# Altium integrated library SubjuGator8.IntLib: 306 symbols (part 1 of 2) (continued)
## SEAM-50-02.0-S-08-2-A-K-TR (continued)
part H pins: C14 I2S1_SDIN "I2S Audio Port 1 Data In", C15 I2S1_CLK "I2S Audio Port 1 Clock", D13 I2S1_LRCLK "I2S Audio Port 1 Field Select", D14 I2S1_SDOUT "I2S Audio Port 1 Data Out", E5 I2S3_SDIN "I2S Audio Port 3 Data In", E6 I2S3_CLK "I2S Audio Port 3 Clock", F1 AUDIO_MCLK "Audio Codec Master Clock", F2 GPIO19/AUD_RST "Aidio Codec Reset", F5 I2S3_LRCLK "I2S Audio Port 3 Field Select", F6 I2S3_SDOUT "I2S Audio Port 3 Data Out", G1 I2S0_SDIN "Digital Audio Port 1 Data In", G2 I2S0_CLK "Digital Audio Port 1 Clock", G5 I2S2_CLK "Digital Audio Port 3 Clock", G6 I2S2_SDIN "Digital Audio Port 3 Data In", H1 I2S0_LRCLK "I2S Audio Port 0 Field Select", H2 IS20_SDOUT "I2S Audio Port 0 Data Out", H3 GPIO20/AUD_INT "Audio Codec Interrupt", H5 I2S2_LRCLK "I2S Audio Port 2 Field Select", H6 I2S2_SDOUT "I2S Audio Port 2 Data Out"
part I pins: A6 I2C_PW_CLK "PM I2C Bus Clock", A15 UART2_CTS# "UART 2 Clear to Send", A16 UART2_RTS# "UART 2 Request to Send", A20 I2C_GP1_DAT "General I2C Bus #1 Data", A21 I2C_GP1_CLK "General I2C Bus #1 Clock", B6 I2C_PM_DAT "PM I2C Bus Data", B15 UART2_RX "UART 2 Receive", B16 UART2_TX "UART 2 Transmit", C6 I2C_CAM_CLK "Camera I2C Clock", D6 I2C_CAM_DAT "Camera I2C Data", D9 UART1_TX "UART 1 Transmit", D10 UART1_RX "UART 1 Receive", D15 I2C_GP0_DAT "General I2C Bus #1 Data", E3 SPI0_CLK "SPI 0 Clock", E4 SPI0_MISO "SPI 0 MISO", E9 UART1_RTS# "Uart 1 Transmit", E10 UART1_CTS# "Uart 1 Receive", E13 SPI1_CS1# "SPI 1 CHip Select 1", E14 SPI1_CS0# "SPI 1 Chip Select 0", E15 I2C_GP0_CLK "General I2C Bus #0 Clock", F3 SPI0_CS0# "SPI 0 Chip Select 0", F4 SPI0_MOSI "SPI 0 MOSI", F13 SPI1_MOSI "SPI 1 MOSI", F14 SPI1_MISO "SPI 1 MISO", F16 SPI2_CS1# "SPI 2 Chip Select 1", G11 UART0_RTS# "UART 1 Return to Send", G12 UART0_RX "UART 1 Receive", G13 SPI1_CLK "SPI 1 Clock", G15 SPI2_MOSI "SPI 2 MOSI", G16 SPI2_CS0# "SPI 2 Chip Select 0", H11 UART0_CTS# "UART 0 Clear to Send", H12 UART0_TX "UART 0 Transmit", H14 SPI2_CLK "SPI 2 Clock", H15 SPI2_MISO "SPI 2 MISO"
part A text: Misc and System
part B text: Power
part C text: Displays
part D text: Cameras
part E text: USB/PCIe/SATA
part F text: Ethernet
part G text: SD and SDIO
part H text: Audio
part I text: Serial

## SFV10R-2STE1HLF
designator U?
CONN FFC TOP 10POS 0.50MM R/A; Manufacturer 1: Amphenol FCI; Manufacturer Part Number 1: SFV10R-2STE1HLF; Supplier Part Number 1: 609-4306-1-ND; Supplier 1: Digi-Key; ComponentLink1URL: https://cdn.amphenol-icc.com/media/wysiwyg/files/drawing/10112793.pdf; ComponentLink1Description: "Datasheet"; ComponentLink2URL: https://www.digikey.com/product-detail/en/amphenol-fci/SFV10R-2STE1HLF/609-4306-1-ND/2626757
footprint SFV10R-2STE1HLF (CONN FFC TOP 10POS 0.50MM R/A)
pins: 0 GND, 1, 2, 3, 4, 5, 6, 7, 8, 9, 10

## SINGLE_SMD_PAD
designator P?
footprint SINGLE_SMD_PAD
pins: 0

## SPST-2DIP-SW
designator P?, comment 219-2LPST
SWITCH TAPE SEAL 2 POS SMD 50V; Supplier 1: Digi-Key; Supplier Part Number 1: CT2192LPST-ND
footprint SPST-4N (For SPST-4DIP)
pins: 1, 2, 3, 4

## SWD_STM32
designator P?, comment SWD
SWD connector matching the pinout on STM Discovery Boards
footprint SWD_STM32 (SWD connector matching the pinout on STM Discovery Boards)
footprint SWD_STM32_SMD (SWD connector matching the pinout on STM Discovery Boards)
pins: 1 3V3, 2 SWCLK, 3 GND, 4 SWDIO, 5 NRST, 6 SWO

## TE-AMP-CONN-2POS
designator P?
2 Positions Header Connector 0.156" (3.96mm) Through Hole Tin; Supplier 1: Digi-Key; Supplier Part Number 1: A99845-ND; Mating Conn. Digi-Key P/N: A103948-ND
footprint TE AMP CONN 2POS (CONN HEADER 2POS STR .156 TIN)
pins: 1, 2

## TE-AMP-CONN-3POS
designator P?
3 Positions Header Connector 0.156" (3.96mm) Through Hole Tin; Supplier 1: Digi-Key; Supplier Part Number 1: A99846-ND; Mating Conn. Digi-Key P/N: A103941-ND
footprint TE AMP CONN 2POS - duplicate (CONN HEADER 3POS STR .156 TIN)
pins: 1, 2, 3

## Test Point
designator TP?
footprint PIN1 (Connector; Plug)
pins: 1

## TX1 standoff
designator MEC?, comment R30-3000702
HEX STANDOFF M3 BRASS 7MM; Manufacturer 1: Harwin, Inc; Manufacturer Part Number 1: R30-3000702; Supplier 1: Digi-Key; Supplier Part Number 1: 952-1498-ND
footprint R30-3000702 (HEX STANDOFF M3 BRASS 7MM)
pins: 1 GND

## tx1_carrier_modified
designator P?, comment Jetson TX1 Connector
CONN MALE 400POS 8ROW SMD GOLD; Manufacturer 1: Samtec Inc; Manufacturer Part Number 1: SEAM-50-02.0-S-08-2-A-K-TR; Supplier 1: Digi-Key; Supplier Part Number 1: SEAM-50-02.0-S-08-2-A-K-TR-ND
footprint tx1_carrier_modified (TX 1 carrier board connector modified to remove pads)
part A pins: A47 RESET_IN# "System Reset output from uill & input to initiate full PMIC reset", A48 CARRIER_PWR_ON "Carrier Power On", B7 CARRIER_STBY# "SOC Power Request", B8 VIN_PWR_BAD# "Input Power Bad", B17 FAN_TACH "Fan Tach", B50 POWER_BTN# "Power on", C16 FAN_PWM "Fan PWM"
part B pins: A1 VDD_IN "Main VDD Input", A2 VDD_IN "Main VDD Input", A3 GND, A4 GND, A28 GND, A37 GND, A40 GND, A43 GND, A50 VDD_RTC "Tegra Real Time Clock block power", B1 VDD_IN "Main VDD Input", B2 VDD_IN "Main VDD Input", B3 GND, B4 GND, B14 GND, B31 GND, B38 GND, B41 GND, B44 GND, B47 GND, C1 VDD_IN "Main VDD Input", C2 VDD_IN "Main VDD Input", C3 GND, C4 GND, C21 GND, C24 GND, C27 GND, C30 GND, C33 GND, C36 GND, C39 GND, C42 GND, C45 GND, D20 GND, D23 GND, D26 GND, D29 GND, D32 GND, D35 GND, D38 GND, D41 GND, D44 GND, E19 GND, E22 GND, E25 GND, E28 GND, E31 GND, E34 GND, E37 GND, E40 GND, E43 GND, E46 GND, F10 GND, F15 GND, F21 GND, F24 GND, F27 GND, F30 GND, F33 GND, F36 GND, F39 GND, F42 GND, F45 GND, F49 GND, G3 GND, G17 GND, G20 GND, G23 GND, G26 GND, G29 GND, G32 GND, G35 GND, G38 GND, G41 GND, G44 GND, G47 GND, G50 GND, H19 GND, H22 GND, H25 GND, H28 GND, H31 GND, H34 GND, H37 GND, H40 GND, H43 GND, H46 GND, H49 GND
part C pins: A18 USB1_EN_OC# "USB 3.0 Type A, USB Enable 1", A38 USB1_D+ "USB 2.0, Port 1 Data+", A39 USB1_D- "USB 2.0, Port 1 Data-", C43 USB_SS0_TX+ "USB 3.0 #0 Transmit+ (PCIe Lane 5)", C44 USB_SS0_TX- "USB 3.0 #0 Transmit- (PCIe Lane 5)", F40 PEX2_RX+ "PCIe Lane 2 Receive+", F41 PEX2_RX- "PCIe Lane 2 Receive-", F43 USB_SS0_RX+ "USB 3.0 #0 Receive+ (PCIe Lane 5)", F44 USB_SS0_RX- "USB 3.0 #0 Receive- (PCIe Lane 5)", G39 PEX_RFU_RX+ "PCIe Lane RFU Receive+", G40 PEX_RFU_RX- "PCIe Lane RFU Receive-", G42 USB_SS1_RX+ "USB 3.0 #1 or PCIe Lane 3 Receive+", G43 USB_SS1_RX- "USB 3.0 #1 or PCIe Lane 3 Receive-", G45 SATA_RX+ "SATA Receive+", G46 SATA_RX- "SATA Receive-", H41 PEX1_RX+ "PCIe Lane 1 Receive+", H42 PEX1_RX- "PCIe Lane 1 Receive-", H44 PEX0_RX+ "PCIe Lane 0 Receive+", H45 PEX0_RX- "PCIe Lane 0 Receive-"
part D pins: E47 GBE_LINK_ACT# "GbE RJ45 connector Link ACT LED0", E48 GBE_MDI0+ "GbE Transformer Data 0+", E49 GBE_MDI0- "GbE Transformer Data 0-", F46 GBE_LINK1000# "GbE RJ45 connector Link 1000 LED2", F47 GBE_MDI1+ "GbE Transformer Data 1+", F48 GBE_MDI1- "GbE Transformer Data 1-", F50 GBE_LINK100# "GbE RJ45 connector Link 100 LED1", G48 GBE_MDI2+ "GbE Transformer Data 2+", G49 GBE_MDI2- "GbE Transformer Data 2-", H47 GBE_MDI3+ "GbE Transformer Data 3+", H48 GBE_MDI3- "GbE Transformer Data 3-"
part A text: Misc and System
part B text: Power
part C text: USB/PCIe/SATA
part D text: Ethernet

## USB 3.0 A
designator USB?
USB - A USB 3.0, Super Speed Receptacle Connector 9 Position Through Hole, Right Angle, Horizontal; Manufacturer Part Number 1: 483930003; Manufacturer 1: Molex; Supplier 1: Digi-Key; Supplier Part Number 1: WM10413CT-ND
footprint USB 3.0 A (0483930003)
pins: 1 VBUS, 2 D-, 3 D+, 4 GND, 5 STDA_SSRX-, 6 STDA_SSRX+, 7 GND_DRAIN, 8 STDA_SSTX-, 9 STDA_SSTX+, SH SHIELD

## USB Micro
designator P?  (value not drawn)
USB Mini B Metal Shield SMT; Supplier 1: Digi-Key; Supplier Part Number 1: 609-4613-1-ND
footprint 10118192-0001LF (USB Micro-B Recepticle)
pins: 1 VBUS, 2 D-, 3 D+, 4 ID, 5 GND, SHD

## UX60SC-MB-5ST
designator P?  (value not drawn)
USB Mini B Metal Shield SMT; Supplier 1: Digi-Key; Supplier Part Number 1: H11671CT-ND
footprint UX60SC-MB-5ST (USB Mini-B Recepticle)
pins: 1 VBUS, 2 D-, 3 D+, 4 ID, 5 GND, SHD

## WSBM8518L1000JT-MOLEX_4
designator P?
4 pins of molex type MX150 male to female connector; Manufacturer 1: Vishay-Dale; Manufacturer Part Number 1: WSBM8518L1000JK; Mating Connector 1: 33472-4001; Supplier Number 1: Digi-Key; Supplier Part Number 1: 541-1906-ND
footprint WSBM8518L1000JT-MOLEX_4 (4 pins of molex type MX150 male to female connector)
pins: 1, 2, 3, 4


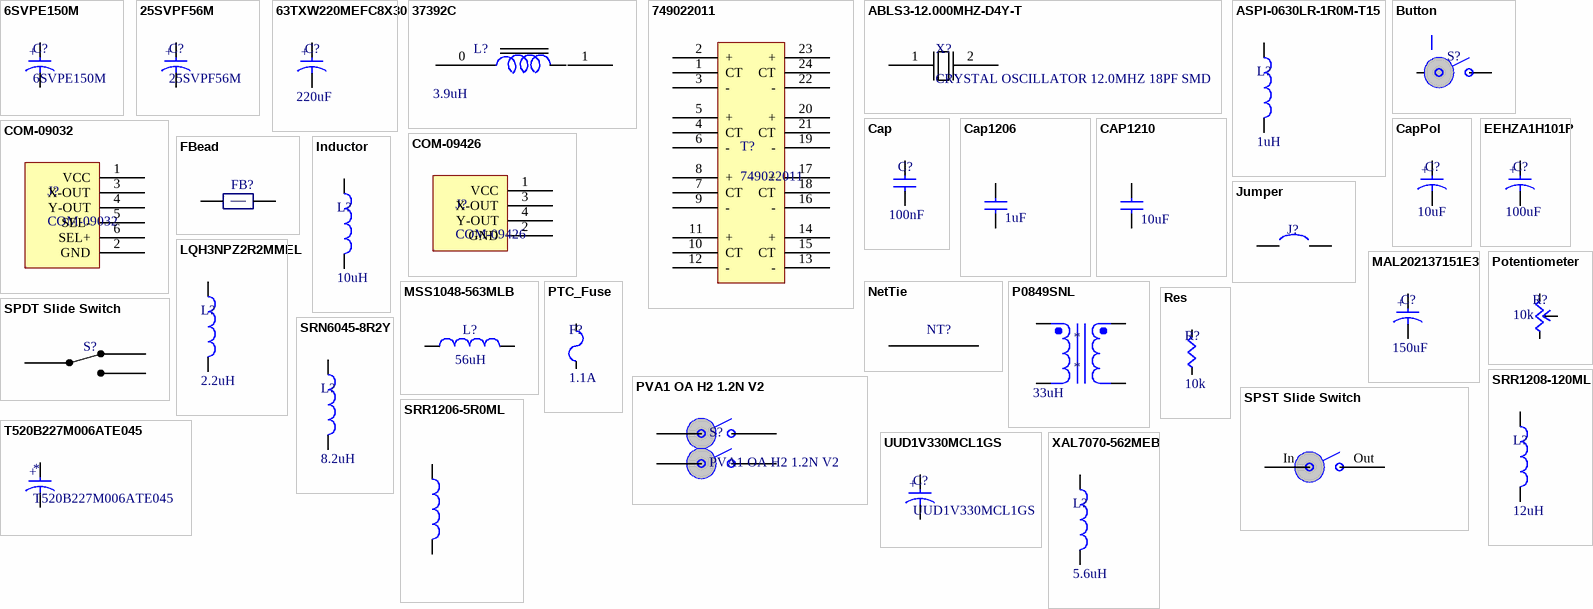
[diagram p3: symbols 6SVPE150M to XAL7070-562MEB]

## 6SVPE150M
designator C?
CAP POLYMER 150UF 20% 6.3V SMD; Manufacturer 1: Panasonic Electronic Components; Supplier 1: Digi-Key; Manufacturer Part Number 1: 6SVPE150M; Supplier Part Number 1: P16614CT-ND
footprint 6SVPE150M (CAP POLYMER 150UF 20% 6.3V SMD)
footprint PCV1J560MCL2GS
pins: 1 A, 2 B
text: +

## 25SVPF56M
designator C?
CAP POLYMER 56UF 20% 25V SMD; Manufacturer 1: Panasonic Electronic Components; Supplier 1: Digi-Key; Manufacturer Part Number 1: 25SVPF56M; Supplier Part Number 1: P16514CT-ND
footprint 25SVPF56M (CAP POLYMER 56UF 20% 25V SMD)
pins: 1 A, 2 B
text: +

## 63TXW220MEFC8X30
designator C?  value 220uF  (hidden comment: *)
CAP ALUM 220UF 63V 20% RADIAL; Supplier 1: Digi-Key; Supplier Part Number 1: 1189-1484-ND
footprint 63TXW220MEFC8X30
footprint 63TXW220MEFC8X30_inverted
pins: +, -

## 37392C
designator L?  (value not drawn)
INDUCTOR 3.90UH 10.0A SMD; Supplier 1: Digi-Key; Supplier Part Number 1: 811-2518-1-ND
footprint 37392C (INDUCTOR 3.90UH 10.0A SMD)
footprint 732-1247-1-ND (FIXED IND 68UH 3.2A 89 MOHM SMD)
footprint 732-1247-1-ND (FIXED IND 68UH 3.2A 89 MOHM SMD)
pins: 0, 1
text: 3.9uH

## 749022011
designator T?
TRANSFORMER LAN 10/100/1000 POE; Manufacturer 1: Wurth Electronics; Manufacturer Part Number 1: 749022011; Supplier 1: Digi-Key; Supplier Part Number 1: 732-3271-1-ND
footprint 749022011 (TRANSFORMER LAN 10/100/1000 POE)
pins: 1 CT, 2 +, 3 -, 4 CT, 5 +, 6 -, 7 CT, 8 +, 9 -, 10 CT, 11 +, 12 -, 13 -, 14 +, 15 CT, 16 -, 17 +, 18 CT, 19 -, 20 +, 21 CT, 22 -, 23 +, 24 CT

## ABLS3-12.000MHZ-D4Y-T
designator X?, comment CRYSTAL OSCILLATOR 12.0MHZ 18PF SMD
12MHz ±30ppm Crystal 18pF 50 Ohms HC-49/US; Manufacturer 1: Abracon LLC; Manufacturer Part Number 1: ABLS3-12.000MHZ-D4Y-T; Supplier 1: Digi-Key; Supplier Part Number 1: 535-10850-6-ND; ComponentLink1Description: Datasheet; ComponentLink1URL: https://abracon.com/Resonators/ABLS3.pdf; ComponentLink2Description: Website; ComponentLink2URL: https://www.digikey.com/product-detail/en/abracon-llc/ABLS3-12.000MHZ-D4Y-T/535-10850-6-ND/2624593
footprint ABLS3-12.000MHZ-D4Y-T
pins: 1, 2

## ASPI-0630LR-1R0M-T15
designator L?  Inductance: 1uH  (hidden comment: ASPI-0630LR-1R0M-T15)
FIXED IND 1UH 12A 9 MOHM SMD; Manufacturer 1: Abracon; Supplier 1: Digi-Key; Supplier Part Number 1: ASPI-0630LR-1R0M-T15CT-ND; Manufacturer Part Number 1: ASPI-0630LR-1R0M-T15
pins: 1 A, 2 B

## Button
designator S?  (value not drawn)
SPST Button; Supplier 1: Digi-Key; Supplier Part Number 1: CKN9087CT-ND
footprint PTS645xxxxSMTR92 (PTS645 Series SMT 6 mm Tactile Switch)
pins: A, B

## Cap
designator C?  value 100nF  (hidden comment: *)
Supplier 1: Digi-Key; Supplier Part Number 1: 1276-1000-1-ND
footprint CAPC0603 (Chip Capacitor, 2-Leads, Body 1.60x0.80mm, IPC Medium Density)
footprint CAPC1206 (Chip Capacitor, 2-Leads, Body 3.20x1.60mm, IPC Medium Density)
footprint CAPC0805 (Chip Capacitor, 2-Leads, Body 2.01x1.25mm, IPC Medium Density)
footprint CAPC0402 (Chip Capacitor, 2-Leads, Body 1.00x0.50mm, IPC Medium Density)
footprint CAP2225 (Chip Capacitor, 2-Leads, Body 5.60x6.40mm, IPC Medium Density)
footprint CAP1808 (Chip Capacitor, 2-Leads, Body 4.50x2.00mm, IPC Medium Density)
footprint CAP1210
pins: 1 A, 2 B

## Cap1206
designator C?  value 1uF
CAP CER 1UF 50V 10% X7R 1206; Supplier 1: Digi-Key; Supplier Part Number 1: 587-2230-1-ND
footprint CAP1206
pins: 1 A, 2 B

## CAP1210
designator C?  value 10uF
CAP CER 10UF 50V 20% X5R 1210; Supplier 1: Digi-Key; Supplier Part Number 1: 587-2225-1-ND
footprint CAP1210
pins: 1 A, 2 B

## CapPol
designator C?, comment value 10uF  (hidden comment: Cap Tant)
CAP TANT 47UF 10V 10% 1411; Supplier 1: Digi-Key; Supplier Part Number 1: 399-9728-1-ND
footprint CAPP0603 (Chip Capacitor, 2-Leads, Body 1.60x0.80mm, IPC Medium Density)
footprint CAP1000uF (CAP ALUM 1000UF 50V 20% RADIAL)
footprint CAP22uF100V (CAP ALUM 22UF 100V 20% RADIAL)
footprint ELXZ500ELL680MF15D (CAP ALUM 68UF 50V 20% RADIAL)
footprint UPW1E121MED (CAP ALUM 120UF 25V 20% RADIAL)
footprint EEE-FT1H221AP (CAP ALUM 220UF 50V 20% SMD)
footprint cap10uf
footprint EKMH500VSN562MQ40T
footprint 1206
footprint XH414HG-IV01E (CAP 80MF 3.3V SURFACE MOUNT)
footprint CAP56UF
footprint PCV1J560MCL2GS
footprint 565-1720-ND (CAP ALUM 56UF 20% 63V RADIAL 0.315" diameter and 0.512" height)
footprint ESY227M050AH2AA
pins: 1 A, 2 B
text: +

## COM-09032
designator J?
2 Axis 10 kOhms Through Hole Joystick Potentiometer; Manufacturer 1: SparkFun Electronics; ComponentLink1: Datasheet; Supplier 1: Digi-Key; Supplier Part Number 1: 1568-1526-ND; Manufacturer Part Number 1: COM-09032; ComponentLink1URL: https://media.digikey.com/pdf/Data%20Sheets/Sparkfun%20PDFs/COM-09032_Web.pdf; ComponentLink2: *; ComponentLink2URL: https://www.sparkfun.com/products/9032
footprint Joystick (Footprint for COM-09426 and COM-09032)
pins: 1 VCC, 2 GND, 3 X-OUT, 4 Y-OUT, 5 SEL-, 6 SEL+

## COM-09426
designator J?
2 Axis Panel Mount Joystick Potentiometer; Manufacturer 1: SparkFun Electronics; Supplier 1: Digi-Key; Supplier Part Number 1: COM-09426-ND; Manufacturer Part Number 1: COM-09426; ComponentLink1URL: https://media.digikey.com/pdf/Data%20Sheets/Sparkfun%20PDFs/COM-09426_Web.pdf; ComponentLink1Description: Datasheet; ComponentLink2URL: https://www.sparkfun.com/products/9426; ComponentLink2Description: Website
footprint Joystick (Footprint for COM-09426 and COM-09032)
pins: 1 VCC, 2 GND, 3 X-OUT, 4 Y-OUT

## EEHZA1H101P
designator C?  value 100uF  (hidden comment: EEHZA1H101P)
CAP ALUM POLY HYB 100UF 50V SMD; Manufacturer 1: Panasonic; Tolerance: 20%; Supplier 1: Digi-Key; Supplier Part Number 1: P15442CT-ND; Manufacturer Part Number 1: EEHZA1H101P; Voltage: 50V; ComponentLink1URL: https://na.industrial.panasonic.com/products/capacitors/aluminum-electrolytic-capacitors/conductive-polymer-hybrid-aluminum-electrolytic/series/za-high-temp-reflow/ABA0135/model/EEHZA1H101P; ComponentLink1Description: Web Site; ComponentLink2URL: https://industrial.panasonic.com/cdbs/www-data/pdf/RDD0000/ABA0000C1221.pdf; ComponentLink2Description: Data Sheet; ComponentLink3URL: https://industrial.panasonic.com/cdbs/www-data/pdf/RDD0000/ABA0000COS44.pdf; ComponentLink3Description: ZA Series Technical Data
footprint EEHZA1H101P (CAP ALUM POLY HYB 100UF 50V SMD)
pins: 1, 2
text: +

## FBead
designator FB?  (value not drawn)
Ferrite Bead; Supplier 1: Digi-Key; Supplier Part Number 1: 445-2988-1-ND
footprint RES0603 (Chip Resistor, 2-Leads, Body 1.60x0.80mm, IPC Medium Density)
pins: 1 A, 2 B

## Inductor
designator L?  Inductance: 10uH  (hidden comment: *)
Supplier 1: Digi-Key; Supplier Part Number 1: ?
footprint SLF7045 (Indufctors for Power Circuits Wound Ferrite)
footprint IHLP-6767 (Low profile, high current IHLP inductor)
footprint SLF7045T-101MR50-PF (INDUCTOR SHIELD PWR 100UH 7045)
footprint CDPH4D19F (SMD Power Inductor)
footprint RLS-567-R
pins: 1 A, 2 B

## Jumper
designator J?  (value not drawn)
Single Jumper on 1x2 Male Header
footprint HEADER_MALE_1X2
pins: 1, 2

## LQH3NPZ2R2MMEL
designator L?  Inductance: 2.2uH  (hidden comment: LQH3NPZ2R2MMEL)
Manufacturer 1: Murata Electronics North America; Supplier 1: Digi-Key; Supplier Part Number 1: 490-15973-1-ND; Manufacturer Part Number 1: LQH3NPZ2R2MMEL
footprint LQH3NPZ2R2MMEL (FIXED IND 2.2UH 2.1A 78 MOHM)
pins: 1 A, 2 B

## MAL202137151E3
designator C?  value 150uF  (hidden comment: *)
CAP ALUM 150UF 40V 20% AXIAL; Supplier 1: Digi-Key; Supplier Part Number 1: 4050PHCT-ND
footprint MAL202137151E3
pins: +, -

## MSS1048-563MLB
designator L?  value 56uH  (hidden comment: MSS1048-563MLB)
FIXED IND 56UH 1.7A 126 MOHM; Manufacturer 1: Coilcraft; Manufacturer Part Number 1: MSS1048-563MLB; ComponentLink1Description: Web Site; ComponentLink1URL: https://www.coilcraft.com/mss1048.cfm; Supplier 1: Coilcraft; Supplier Part Number 1: MSS1048-563MLB
footprint MSS1048-563MLB (FIXED IND 56UH 1.7A 126 MOHM)
pins: 1, 2

## NetTie
designator NT?  (value not drawn)  (net tie, no BOM)
Ties two nets together
footprint NT_5mil (Thin Net Tie)
pins: 1, 2

## P0849SNL
designator *  Inductance: 33uH
footprint PULSE_BIGFOOT (SMT Power Inductor)
pins: 1 (power), 2 (power), 3 (power), 4 (power)

## Potentiometer
designator R?, comment value 10k  (hidden comment: Pot)
Potentiometer; Supplier 1: Digi-Key; Supplier Part Number 1: ST4ETA103CT-ND
footprint ST4ETA103 (TRIMMER 10K OHM 0.25W SMD)
pins: 1, 2, 3

## PTC_Fuse
designator F?, comment value 1.1A  (hidden comment: PTC Fuse)
Supplier 1: Digi-Key; Supplier Part Number 1: 507-1744-1-ND
footprint PTC7451X11N (Chip PTC, 2920, 7351 metric 2-Leads, Body 7.36x5.12mm, IPC Medium Density)
pins: 1 A, 2 B

## PVA1 OA H2 1.2N V2
designator S?
Pushbutton Switch DPST-NO Keyswitch Through Hole; Manufacturer: C&K; Supplier 1: Digi-Key; Supplier Part Number 1: 401-1135-ND; Manufacturer Part Number: PVA1 OA H2 1.2N V2; ComponentLink1URL: https://www.ckswitches.com/media/1343/pva.pdf; ComponentLink1Description: Datasheet; ComponentLink2URL: *
footprint PVA1 OA H2 1.2N V2
pins: 1, 2, 3, 4

## Res
designator R?  value 10k  (hidden comment: *)
Supplier 1: Digi-Key; Supplier Part Number 1: RMCF0603JT10K0CT-ND
footprint RES0603 (Chip Resistor, 2-Leads, Body 1.60x0.80mm, IPC Medium Density)
footprint FMP300 (Power resistor)
footprint FMP200 (Power resistor Yageo 2W)
footprint RES0402 (Chip Resistor, 2-Leads, Body 1.00x0.50mm, changed from previous)
footprint RES2512 (Chip Resistor, 2-Leads, Body 6.35x3.20mm, IPC Medium Density)
footprint RES1206 (Chip Resistor, 2-Leads, Body 3.20x1.60mm, IPC Medium Density)
footprint RES0805 (Chip Resistor, 2-Leads, Body 2.01x1.25mm, IPC Medium Density)
footprint WSBM8518L1000JT-MOLEX_2 (2 shunt resistor pins of MOLEX type WSBM8518L1000JT)
pins: 1 A, 2 B

## SPDT Slide Switch
designator S?  (value not drawn)
Supplier 1: Digi-Key; Supplier Part Number 1: 563-1318-1-ND
footprint CL-SB-12B-01T (SWITCH SLIDE SPDT 200MA 12V)
pins: 1, 2, 3

## SPST Slide Switch
designator SW?, comment 360-2610-ND
SPST Slide Switch; Supplier 1: Digi-Key; Supplier Part Number 1: 360-2610-ND
footprint AS11CP (SPST Slide Switch)
pins: In, Out

## SRN6045-8R2Y
designator L?  Inductance: 8.2uH  (hidden comment: SRN6045-8R2Y)
FIXED IND 8.2UH 2.7A 55 MOHM SMD; Manufacturer 1: Bourns Inc; Supplier 1: Digi-Key; Supplier Part Number 1: SRN6045-8R2YCT-ND; Manufacturer Part Number 1: SRN6045-8R2Y
footprint SRN6045 Series Inductor (SRN 6045 Series Inductor Bourns Inc)
pins: 1 A, 2 B

## SRR1206-5R0ML
designator L?, comment 5uH
FIXED IND 5UH 4.7A 22 MOHM SMD; Supplier 1: Digi-Key; Supplier Part Number 1: SRR1206-5R0MLCT-ND
footprint IND_2 (Inductor)
pins: 1 A, 2 B

## SRR1208-120ML
designator L?  Inductance: 12uH  (hidden comment: SRR1208-120ML)
FIXED IND 12UH 4.8A 25 MOHM SMD; Manufacturer 1: Bourns Inc; Supplier 1: Digi-Key; Supplier Part Number 1: SRR1208-120MLCT-ND; Manufacturer Part Number 1: SRR1208-120ML
footprint SRR1208 Series (SSR1208 Series Inductor from Bourns Inc)
pins: 1 A, 2 B

## T520B227M006ATE045
designator *
CAP TANT POLY 220UF 6.3V 1411; Manufacturer 1: Kemet; Manufacturer Part Number 1: T520B227M006ATE045; Supplier 1: Digi-Key; Supplier Part Number 1: 399-5755-1-ND
footprint C1411-molded,polarized (Molded Capacitor, 2-Leads, Body 3.50x2.80mm, IPC Medium Density)
pins: 1 A, 2 B
text: +

## UUD1V330MCL1GS
designator C?
CAP ALUM 33UF 20% 35V SMD; Manufacturer 1: Nichicon; Supplier 1: Digi-Key; Manufacturer Part Number 1: UUD1V330MCL1GS; Supplier Part Number 1: 493-2286-1-ND
footprint UUD1V330MCL1GS (CAP ALUM 33UF 20% 35V SMD)
pins: 1 A, 2 B
text: +

## XAL7070-562MEB
designator L?  Inductance: 5.6uH  (hidden comment: XAL7070-562MEB)
FIXED IND 5.6UH 13A 13.67 MOHM SMD; Manufacturer 1: Coil Craft; Manufacturer Part Number 1: XAL7070-562MEB
footprint XAL7070-562MEB (5.6uH inductor)
pins: 1 A, 2 B


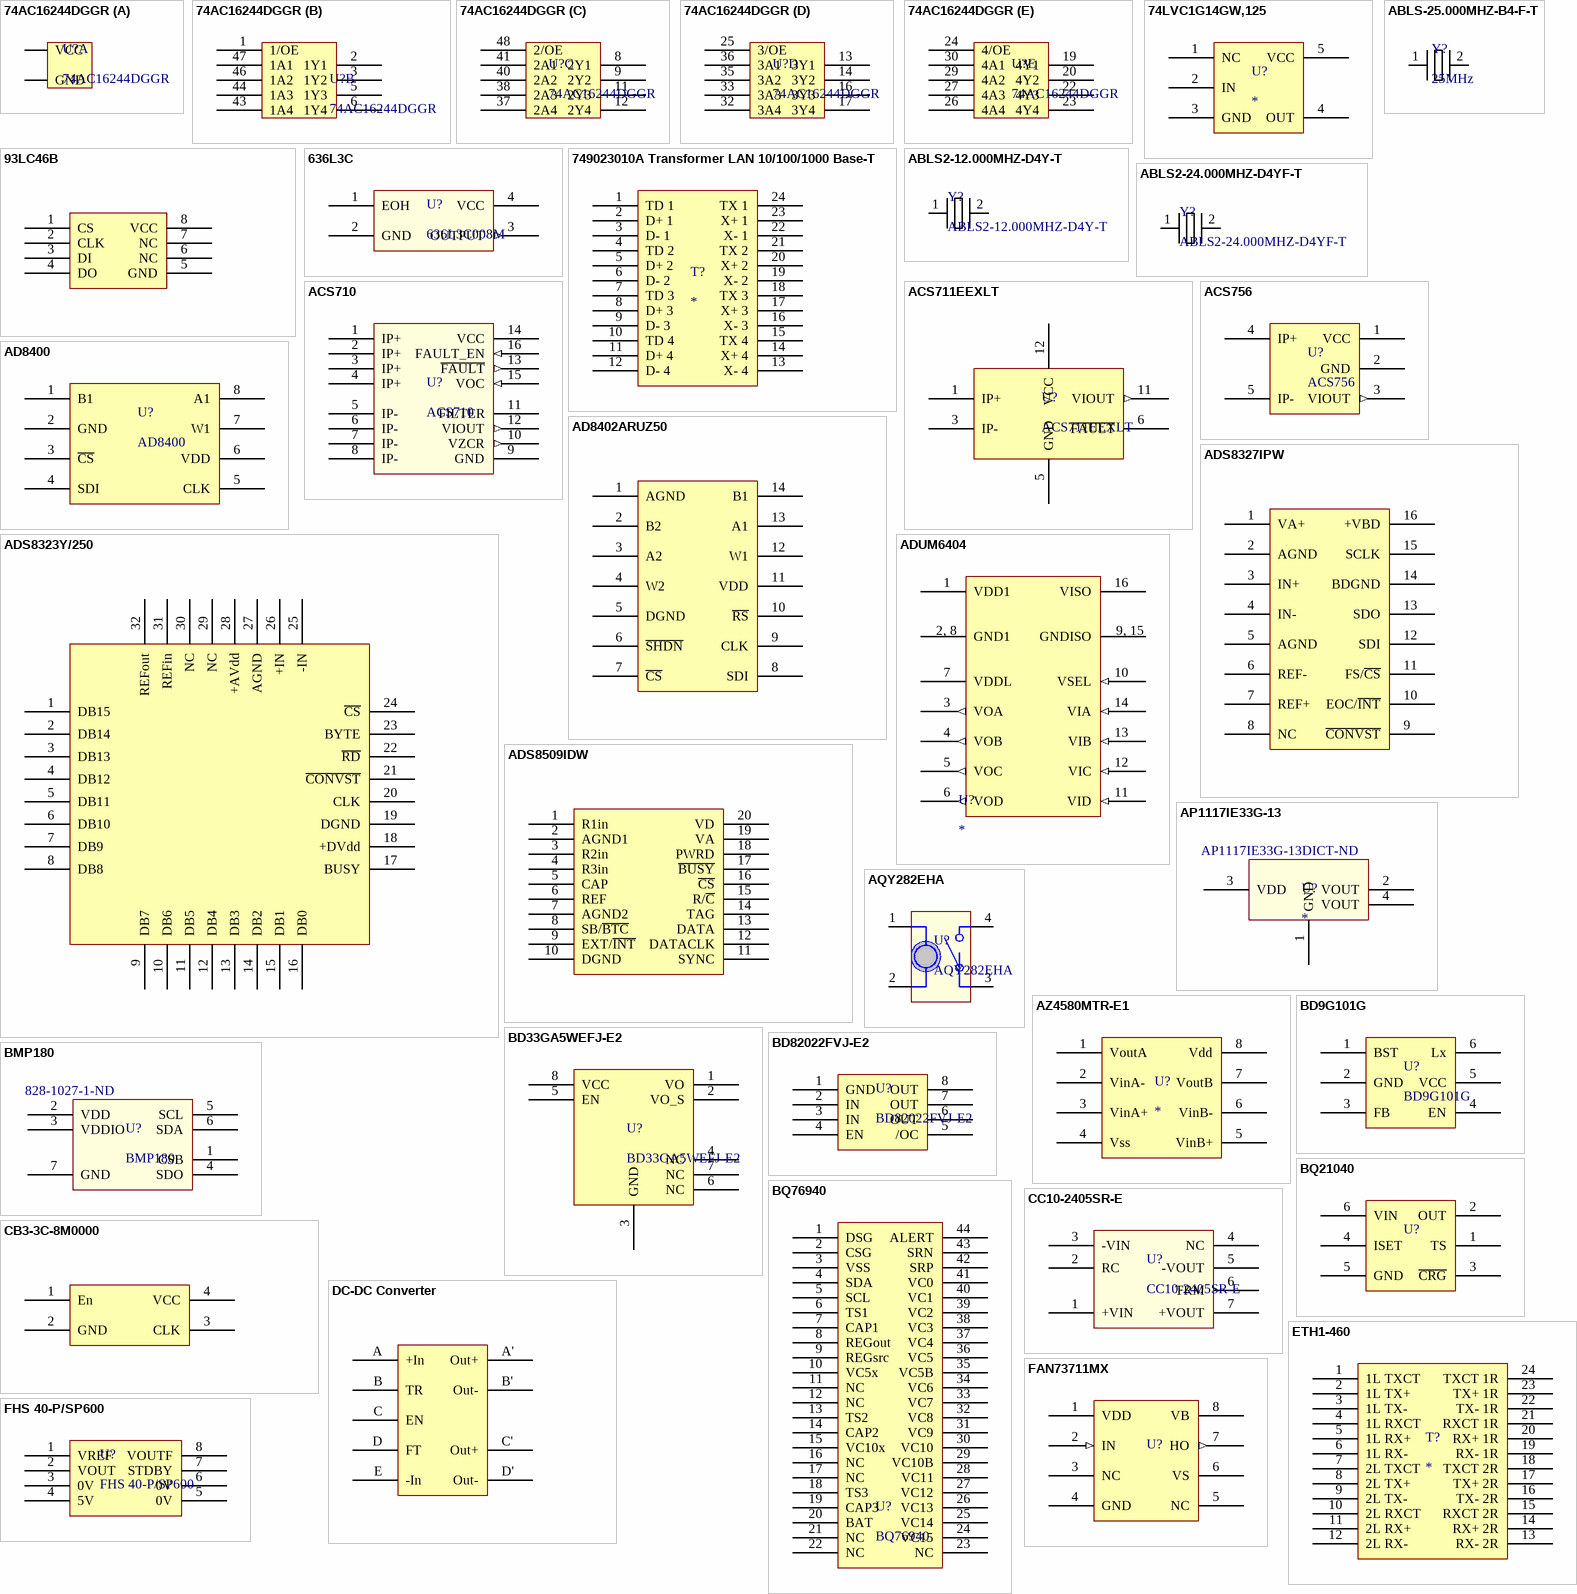
[diagram p4: symbols 74AC16244DGGR to FHS 40-P/SP600]

## 74AC16244DGGR
designator U?
IC BUFF/DVR TRI-ST 16BIT 48TSSOP
footprint 74AC16244DGGR (TSSOP, 48-Leads, Body 12.50x6.10mm, Pitch 0.50mm, IPC Medium Density)
part A pins: GND, VCC
part B pins: 1 1/OE, 2 1Y1, 3 1Y2, 5 1Y3, 6 1Y4, 43 1A4, 44 1A3, 46 1A2, 47 1A1
part C pins: 8 2Y1, 9 2Y2, 11 2Y3, 12 2Y4, 37 2A4, 38 2A3, 40 2A2, 41 2A1, 48 2/OE
part D pins: 13 3Y1, 14 3Y2, 16 3Y3, 17 3Y4, 25 3/OE, 32 3A4, 33 3A3, 35 3A2, 36 3A1
part E pins: 19 4Y1, 20 4Y2, 22 4Y3, 23 4Y4, 24 4/OE, 26 4A4, 27 4A3, 29 4A2, 30 4A1

## 74LVC1G14GW,125
designator U?
IC SCHMITT-TRIG INV 5TSSOP; Supplier Part Number 1: 1727-3072-1-ND; Supplier 1: Digi-Key
footprint SOT35-5pin (For 296-38736-1-ND)
pins: 1 NC, 2 IN, 3 GND, 4 OUT, 5 VCC

## 93LC46B
designator U?
IC EEPROM 1KBIT 2MHZ 8SOIC; Supplier 1: Digi-Key; Supplier Part Number 1: 93LC46BT-I/SNCT-ND
footprint SOIC-8pin (For 296-1345-1-ND)
pins: 1 CS, 2 CLK, 3 DI, 4 DO, 5 GND, 6 NC, 7 NC, 8 VCC

## 636L3C
designator U?, comment 636L3C008M
HCMOS/TTL Clock Oscillator; Supplier 1: Digi-Key; Supplier Part Number 1: CTX1005CT-ND
footprint 636L3C
pins: 1 EOH, 2 GND (power), 3 OUTPUT (out), 4 VCC (power)

## 749023010A Transformer LAN 10/100/1000 Base-T
designator T?
TRANSFORMER LAN 10/100/1000 SMD; Supplier 1: Digi-Key; Supplier Part Number 1: 732-5714-1-ND
footprint 749023010A (TRANSFORMER LAN 10/100/1000 SMD)
pins: 1 TD 1, 2 D+ 1, 3 D- 1, 4 TD 2, 5 D+ 2, 6 D- 2, 7 TD 3, 8 D+ 3, 9 D- 3, 10 TD 4, 11 D+ 4, 12 D- 4, 13 X- 4, 14 X+ 4, 15 TX 4, 16 X- 3, 17 X+ 3, 18 TX 3, 19 X- 2, 20 X+ 2, 21 TX 2, 22 X- 1, 23 X+ 1, 24 TX 1

## ABLS2-12.000MHZ-D4Y-T
designator Y?
12MHz ±30ppm Crystal 18pF 50 Ohm -40°C ~ 85°C Surface Mount HC49/US; Supplier 1: Digi-Key; Supplier Part Number 1: 535-9869-1-ND
footprint HC49/US
pins: 1, 2

## ABLS2-24.000MHZ-D4YF-T
designator Y?
24MHz ±30ppm Crystal 18pF 40 Ohm -40°C ~ 85°C Surface Mount HC49/US; Supplier 1: Digi-Key; Supplier Part Number 1: 535-9881-1-ND
footprint HC49/US
pins: 1, 2

## ABLS-25.000MHZ-B4-F-T
designator Y?, comment 25MHz
25MHz ±30ppm Crystal 18pF 40 Ohm -20°C ~ 70°C Surface Mount HC49/US; Supplier Part Number 1: 535-10235-1-ND; Supplier 1: Digi-Key
footprint HC49/US
pins: 1, 2

## ACS710
designator U?
Current Sensor with Integrated Overcurrent Detection; Supplier 1: Digi-Key; Supplier Part Number 1: 620-1334-1-ND
footprint ACS710 (SOIC, 16-Leads, Body 10.5x7.6mm (max), Pitch 1.27mm, IPC Medium Density)
footprint ACS710_NOPIN (Hacked footprint to make battery board look nice.)
pins: 1 IP+, 2 IP+, 3 IP+, 4 IP+, 5 IP-, 6 IP-, 7 IP-, 8 IP-, 9 GND (power), 10 VZCR (out), 11 FILTER, 12 VIOUT (out), 13 ~{FAULT} (out), 14 VCC (power), 15 VOC (in), 16 FAULT_EN (in)

## ACS711EEXLT
designator U?
Hall Effect Linear Current Sensor with Overcurrent  Fault Output for < 100 V Isolation Applications; Supplier 1: Digi-Key; Supplier Part Number 1: 620-1484-1-ND
footprint ACS711KEXLT
pins: 1 IP+, 3 IP-, 5 GND, 6 ~{FAULT} (oc), 11 VIOUT (out), 12 VCC (power)

## ACS756
designator U?
Hall Effect-Based Linear Current Sensor IC; Supplier 1: Digi-Key; Supplier Part Number 1: 620-1239-ND
footprint ACS756 (Hall Effect-Based Linear Current Sensor)
pins: 1 VCC (power), 2 GND (power), 3 VIOUT (out), 4 IP+, 5 IP-

## AD8400
designator U?
IC DGTL POT 8BIT 100K 1CH 8-SOIC; Supplier 1: Digi-Key; Supplier Part Number 1: AD8400ARZ100-ND
footprint SOIC-8PIN (For 296-1345-1-ND)
pins: 1 B1, 2 GND, 3 ~{CS}, 4 SDI, 5 CLK, 6 VDD, 7 W1, 8 A1

## AD8402ARUZ50
designator U?, comment 50k Pot
IC POT DIG DUAL 50K 8BIT 14TSSOP; Supplier 1: Digi-Key; Supplier Part Number 1: AD8402ARUZ50-ND
footprint TSSOP-14 (For AD8402ARUZ50-ND (Digital Pot))
pins: 1 AGND, 2 B2, 3 A2, 4 W2, 5 DGND, 6 ~{SHDN}, 7 ~{CS}, 8 SDI, 9 CLK, 10 ~{RS}, 11 VDD, 12 W1, 13 A1, 14 B1

## ADS8323Y/250
designator U?, comment ADC 16bit 500kHz
IC A/D CONV 16BIT BIPLR 32-TQFP; Supplier 1: Digi-Key; Supplier Part Number 1: ADS8323Y/250CT-ND
footprint 32-TQFP (Used for 16 bit external ADC)
pins: 1 DB15, 2 DB14, 3 DB13, 4 DB12, 5 DB11, 6 DB10, 7 DB9, 8 DB8, 9 DB7, 10 DB6, 11 DB5, 12 DB4, 13 DB3, 14 DB2, 15 DB1, 16 DB0, 17 BUSY, 18 +DVdd, 19 DGND, 20 CLK, 21 ~{CONVST}, 22 ~{RD}, 23 BYTE, 24 ~{CS}, 25 -IN, 26 +IN, 27 AGND, 28 +AVdd, 29 NC, 30 NC, 31 REFin, 32 REFout

## ADS8327IPW
designator U?
IC ADC 16BIT 500KSPS 16-TSSOP; Supplier 1: Digi-Key; Supplier Part Number 1: 296-19764-ND
footprint TSSOP-16pin (For 296-19764-ND)
pins: 1 VA+, 2 AGND, 3 IN+, 4 IN-, 5 AGND, 6 REF-, 7 REF+, 8 NC, 9 ~{CONVST}, 10 EOC/~{INT}, 11 FS/~{CS}, 12 SDI, 13 SDO, 14 BDGND, 15 SCLK, 16 +VBD

## ADS8509IDW
designator U?
IC ADC 16BIT 250KSPS SRL 20SOIC; Suppiler Part Number 1: 296-18087-5-ND; Supplier 1: Digi-Key
footprint SOIC-20pin (For 296-18087-5-ND)
pins: 1 R1in, 2 AGND1, 3 R2in, 4 R3in, 5 CAP, 6 REF, 7 AGND2, 8 SB/~{BTC}, 9 EXT/~{INT}, 10 DGND, 11 SYNC, 12 DATACLK, 13 DATA, 14 TAG, 15 R/~{C}, 16 ~{CS}, 17 ~{BUSY}, 18 PWRD, 19 VA, 20 VD

## ADUM6404
designator U?
Digital Isolator, 4 channel, with isolated power
footprint SOIC127P1030X265-16N (SOIC, 16-Leads, Body 10.30x7.50mm, Pitch 1.27mm, IPC Medium Density)
pins: 1 VDD1 (power), 2 GND1 (power), 3 VOA (out), 4 VOB (out), 5 VOC (out), 6 VOD (out), 7 VDDL (power), 8 GND1 (power), 9 GNDISO (power), 10 VSEL (in), 11 VID (in), 12 VIC (in), 13 VIB (in), 14 VIA (in), 15 GNDISO (power), 16 VISO
text: 2, 8; 9, 15

## AP1117IE33G-13
designator U?  Supplier Part Number 1: AP1117IE33G-13DICT-ND
3.3V 1A DROPOUT POSITIVE ADJUSTABLE OR FIXED-MODE REGULATOR; Supplier 1: Digi-Key
footprint AP1117IE33G-13 (SOT223, 4-Leads, Body 6.6x7.1mm (max), Pitch 2.30mm, IPC Medium Density)
pins: 1 GND (power), 2 VOUT (power), 3 VDD (power), 4 VOUT (power)

## AQY282EHA
designator U?
PhotoMOS Solid State Relay; Supplier 1: Digi-Key; Supplier Part Number 1: AQY282EHA-ND
footprint AQY282EHA (SOP, 4-Leads, Body 4.3x4.6mm (max), Pitch 2.54mm, IPC Medium Density)
pins: 1 A, 2 C, 3 S2, 4 S1

## AZ4580MTR-E1
designator U?
IC OPAMP GEN PURP SO-8; Supplier 1: Digi-Key; Supplier Part Number 1: AZ4580MTR-E1DICT-ND
footprint 8-SOIC (Used for LMH6612)
pins: 1 VoutA, 2 VinA-, 3 VinA+, 4 Vss, 5 VinB+, 6 VinB-, 7 VoutB, 8 Vdd

## BD9G101G
designator U?
Simple Step-down Switching Regulators with Built-in Power MOSFET; Supplier 1: Digi-Key; Supplier Part Number 1: BD9G101G-CT-ND
footprint BD9G101G (Simple Step-down Switching Regulators with Built-in Power MOSFET)
pins: 1 BST, 2 GND, 3 FB, 4 EN, 5 VCC, 6 Lx

## BD33GA5WEFJ-E2
designator U?
IC REG LDO 3.3V 0.5A 8HTSOP-J; Supplier 1: Digi-Key; Supplier Part Number 1: BD33GA5WEFJ-E2CT-ND
footprint BD33GA5WEFJ-E2 (IC REG LDO 3.3V 0.5A 8HTSOP-J)
pins: 1 VO, 2 VO_S, 3 GND, 4 NC, 5 EN, 6 NC, 7 NC, 8 VCC

## BD82022FVJ-E2
designator U?
IC USB PWR SW HI SIDE 1CH 8TSSOP; Manufacturer 1: Rohm Semiconductor; Manufacturer Part Number 1: BD82022FVJ-E2; Supplier Part Number 1: BD82022FVJ-E2CT-ND; Supplier 1: Digi-Key
footprint TSSOP-8 (TSOP, 8-Leads, Body 3.00x3.00mm, Pitch 0.65mm, IPC Medium Density)
pins: 1 GND, 2 IN, 3 IN, 4 EN, 5 /OC, 6 OUT, 7 OUT, 8 OUT

## BMP180
designator U?  Supplier Part Number 1: 828-1027-1-ND
Digital Pressure Sensor; Supplier 1: Digi-Key
footprint BMP180
pins: 1 CSB, 2 VDD (power), 3 VDDIO (power), 4 SDO, 5 SCL, 6 SDA, 7 GND (power)

## BQ21040
designator U?  (value not drawn)
IC BAT CHG LI-ION 1 CELL SOT23-6; Manufacturer 1: Texas Instruments; ComponentLink1Description: Datasheet; ComponentLink1URL: http://www.ti.com/lit/ds/symlink/bq21040.pdf; ComponentLink2Description: Website; ComponentLink2URL: http://www.ti.com/product/BQ21040/description; Supplier 1: Digi-Key; Supplier Part Number 1: 296-44196-1-ND; Manufacturer Part Number 1: BQ21040
footprint BQ21040DBVT (IC BAT CHG LI-ION 1 CELL SOT23-6)
pins: 1 TS, 2 OUT, 3 ~{CRG}, 4 ISET, 5 GND, 6 VIN

## BQ76940
designator U?
IC BATT MFMT LI-ION AFE 44TSOP; Supplier 1: Digi-Key; Supplier Part Number 1: 296-37789-5-ND
footprint BQ7694003DBT (TSSOP, 44-Leads, Body 11.15x4.40mm, Pitch 0.50mm, IPC Medium Density)
pins: 1 DSG, 2 CSG, 3 VSS, 4 SDA, 5 SCL, 6 TS1, 7 CAP1, 8 REGout, 9 REGsrc, 10 VC5x, 11 NC, 12 NC, 13 TS2, 14 CAP2, 15 VC10x, 16 NC, 17 NC, 18 TS3, 19 CAP3, 20 BAT, 21 NC, 22 NC, 23 NC, 24 VC15, 25 VC14, 26 VC13, 27 VC12, 28 VC11, 29 VC10B, 30 VC10, 31 VC9, 32 VC8, 33 VC7, 34 VC6, 35 VC5B, 36 VC5, 37 VC4, 38 VC3, 39 VC2, 40 VC1, 41 VC0, 42 SRP, 43 SRN, 44 ALERT

## CB3-3C-8M0000
designator U?, comment 8MHz Oscillator
OSC XO 8.000MHZ HCMOS TTL SMD; Supplier 1: Digi-Key; Supplier Part Number 1: CTX264CT-ND
footprint 4-SMD (For 8MHz Oscillator)
pins: 1 En, 2 GND, 3 CLK, 4 VCC

## CC10-2405SR-E
designator U?
CONV DC/DC 10W SNGL 24V 5V SMD; Manufacturer: TDK-Lambda Americas Inc.; Manufacturer Part Number 1: CC10-2405SR-E; Supplier Part Number 1: 445-3307-ND; Supplier 1: Digi-Key
footprint CC10-2405SR-E (CONV DC/DC 10W SNGL 24V 5V SMD)
pins: 1 +VIN, 2 RC, 3 -VIN, 4 NC, 5 -VOUT, 6 TRM, 7 +VOUT

## DC-DC Converter
designator U?
28V Switching Regulator; Manufacturer 1: Vicorpower; Manufacturer Part Number 1: DCM48AP280T320A50
footprint DCM Footprint (For DC-DC Converter Module)
pins: A +In, A' Out+, B TR, B' Out-, C EN, C' Out+, D FT, D' Out-, E -In

## ETH1-460
designator T?
"PoE Plus" Transformers Audio & Signal ETH1 60W 4pairs PoE+ Magnetic Module; Supplier 1: *; Supplier Part Number 1: *
footprint ETH1-460 ("PoE Plus" Transformers Audio & Signal ETH1 60W 4pairs PoE+ Magnetic Module)
pins: 1 1L TXCT, 2 1L TX+, 3 1L TX-, 4 1L RXCT, 5 1L RX+, 6 1L RX-, 7 2L TXCT, 8 2L TX+, 9 2L TX-, 10 2L RXCT, 11 2L RX+, 12 2L RX-, 13 RX- 2R, 14 RX+ 2R, 15 RXCT 2R, 16 TX- 2R, 17 TX+ 2R, 18 TXCT 2R, 19 RX- 1R, 20 RX+ 1R, 21 RXCT 1R, 22 TX- 1R, 23 TX+ 1R, 24 TXCT 1R

## FAN73711MX
designator U?  (value not drawn)
High current, High-side gate drive IC; Supplier 1: Digi-Key; Supplier Part Number 1: FAN73711MXDKR-ND
footprint FAN73711MXCT (High side FET driver)
pins: 1 VDD, 2 IN (in), 3 NC, 4 GND, 5 NC, 6 VS, 7 HO (out), 8 VB

## FHS 40-P/SP600
designator U?
Supplier 1: Digi-Key; Supplier Part Number 1: 398-1057-1-ND
footprint FHS 40-P/SP600 (SENSOR CURRENT 100A 5V BI 8SOIC)
pins: 1 VREF, 2 VOUT, 3 0V, 4 5V, 5 0V, 6 0V, 7 STDBY, 8 VOUTF

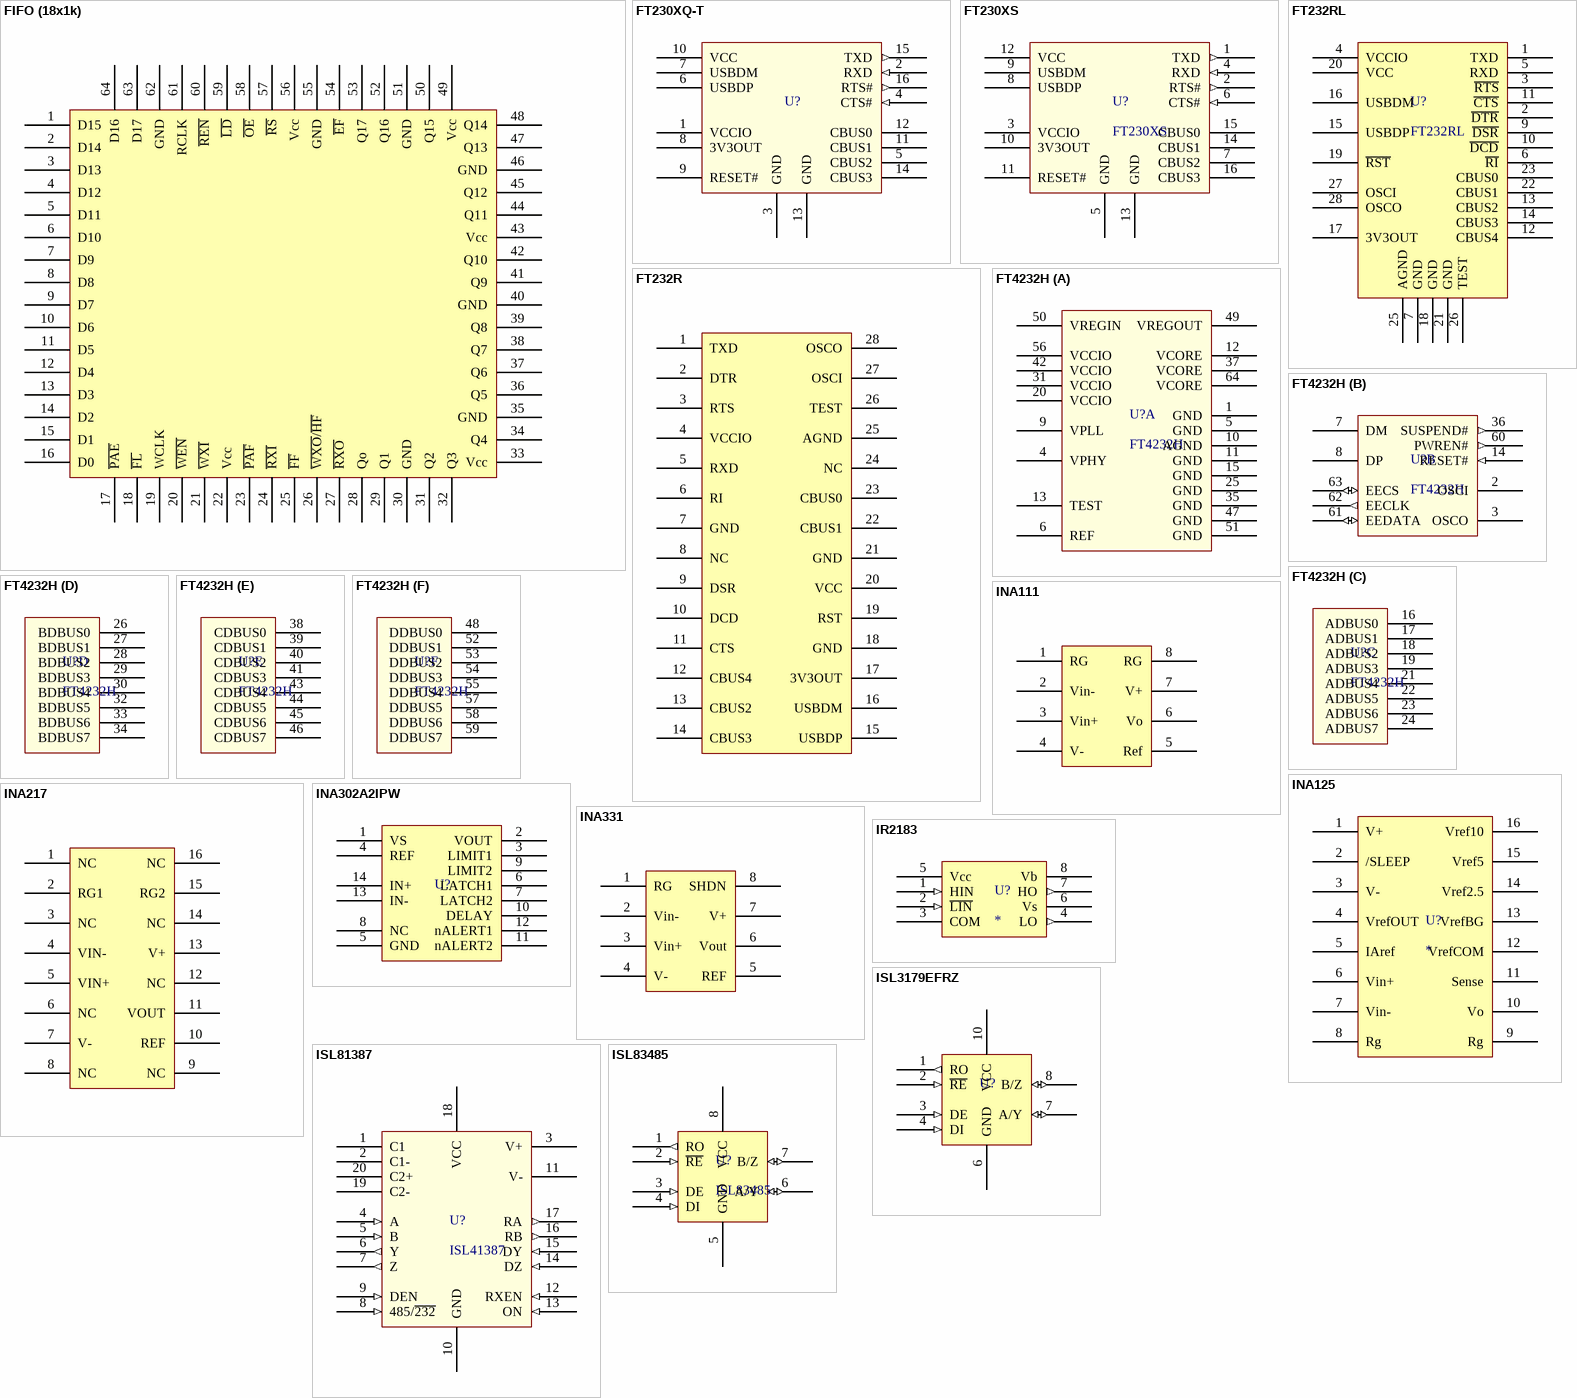
[diagram p5: symbols FIFO (18x1k) to ISL83485]

## FIFO (18x1k)
designator U?
IC SYNC FIFO MEM 1KX18 64LQFP; Supplier 1: Digi-Key; Supplier Part Number 1: CY7C4225-10AXI-ND
footprint 64-LQFP (For IDT 64 pin FIFO)
pins: 1 D15, 2 D14, 3 D13, 4 D12, 5 D11, 6 D10, 7 D9, 8 D8, 9 D7, 10 D6, 11 D5, 12 D4, 13 D3, 14 D2, 15 D1, 16 D0, 17 ~{PAE}, 18 ~{FL}, 19 WCLK, 20 ~{WEN}, 21 ~{WXI}, 22 Vcc, 23 ~{PAF}, 24 ~{RXI}, 25 ~{FF}, 26 ~{WXO}/~{HF}, 27 ~{RXO}, 28 Qo, 29 Q1, 30 GND, 31 Q2, 32 Q3, 33 Vcc, 34 Q4, 35 GND, 36 Q5, 37 Q6, 38 Q7, 39 Q8, 40 GND, 41 Q9, 42 Q10, 43 Vcc, 44 Q11, 45 Q12, 46 GND, 47 Q13, 48 Q14, 49 Vcc, 50 Q15, 51 GND, 52 Q16, 53 Q17, 54 ~{EF}, 55 GND, 56 Vcc, 57 ~{RS}, 58 ~{OE}, 59 ~{LD}, 60 ~{REN}, 61 RCLK, 62 GND, 63 D17, 64 D16

## FT230XQ-T
designator U?  (value not drawn)
IC USB SERIAL BASIC UART 16QFN; Supplier 1: Digi-Key; Supplier Part Number 1: 768-1153-ND
footprint FT230XQ-T (IC USB SERIAL BASIC UART 16QFN)
pins: 1 VCCIO (power), 2 RXD (in), 3 GND (power), 4 CTS# (in), 5 CBUS2, 6 USBDP, 7 USBDM, 8 3V3OUT, 9 RESET#, 10 VCC (power), 11 CBUS1, 12 CBUS0, 13 GND (power), 14 CBUS3, 15 TXD (out), 16 RTS# (out)

## FT230XS
designator U?
USB To Basic UART IC; Supplier 1: Digi-Key; Supplier Part Number 1: 768-1154-5-ND
footprint FT230XS (SOP, 16-Leads, Body 4.90x3.90mm, Pitch 0.64mm, IPC Medium Density)
pins: 1 TXD (out), 2 RTS# (out), 3 VCCIO (power), 4 RXD (in), 5 GND (power), 6 CTS# (in), 7 CBUS2, 8 USBDP, 9 USBDM, 10 3V3OUT, 11 RESET#, 12 VCC (power), 13 GND (power), 14 CBUS1, 15 CBUS0, 16 CBUS3

## FT232R
designator U?
IC USB FS SERIAL UART 28-SSOP; Supplier 1: Digi-Key; Supplier Part Number 1: 768-1007-1-ND
footprint SSOP-28 (FTDI FT232R)
pins: 1 TXD, 2 DTR, 3 RTS, 4 VCCIO, 5 RXD, 6 RI, 7 GND, 8 NC, 9 DSR, 10 DCD, 11 CTS, 12 CBUS4, 13 CBUS2, 14 CBUS3, 15 USBDP, 16 USBDM, 17 3V3OUT, 18 GND, 19 RST, 20 VCC, 21 GND, 22 CBUS1, 23 CBUS0, 24 NC, 25 AGND, 26 TEST, 27 OSCI, 28 OSCO

## FT232RL
designator U?
IC USB FS SERIAL UART 28-SSOP; Supplier Part Number 1: 768-1007-1-ND; Supplier 1: Digi-Key
footprint SSOP_28_N (For FT232RL-Tube)
pins: 1 TXD, 2 ~{DTR}, 3 ~{RTS}, 4 VCCIO, 5 RXD, 6 ~{RI}, 7 GND, 9 ~{DSR}, 10 ~{DCD}, 11 ~{CTS}, 12 CBUS4, 13 CBUS2, 14 CBUS3, 15 USBDP, 16 USBDM, 17 3V3OUT, 18 GND, 19 ~{RST}, 20 VCC, 21 GND, 22 CBUS1, 23 CBUS0, 25 AGND, 26 TEST, 27 OSCI, 28 OSCO